# Altium integrated library Connectors.IntLib: 512 symbols (part 2 of 2) (continued)
## PLS-12RP (continued)

## PLS-14
designator CON?  (value not drawn)
2.54 mm; Note: Connector; Temp.Characteristic: -40C to +85C; Value: *; Publisher: Catcatcat Electronics; Website developer: http://catcatcat.d-lan.dp.ua/; Assembly type: Manual Part
footprint PLS-14
pins: 1, 2, 3, 4, 5, 6, 7, 8, 9, 10, 11, 12, 13, 14

## PLS-16
designator CON?  (value not drawn)
2.54 mm; Note: Connector; Temp.Characteristic: -40C to +85C; Value: *; Publisher: Catcatcat Electronics; Website developer: http://catcatcat.d-lan.dp.ua/; Assembly type: Manual Part
footprint PLS-16
pins: 1, 2, 3, 4, 5, 6, 7, 8, 9, 10, 11, 12, 13, 14, 15, 16

## PLS-20
designator CON?  (value not drawn)
2.54 mm; Note: Connector; Temp.Characteristic: -40C to +85C; Value: *; Publisher: Catcatcat Electronics; Website developer: http://catcatcat.d-lan.dp.ua/; Assembly type: Manual Part
footprint PLS-20
pins: 1, 2, 3, 4, 5, 6, 7, 8, 9, 10, 11, 12, 13, 14, 15, 16, 17, 18, 19, 20

## PLSR-02S
designator CON?  (value not drawn)
2.54 mm; Note: Connector; Temp.Characteristic: -40C to +85C; Value: *; Publisher: Catcatcat Electronics; Website developer: http://catcatcat.d-lan.dp.ua/; Assembly type: Manual Part
footprint PLSR-02S
pins: 1, 2

## PLSR-02SS
designator CON?  (value not drawn)
2.54 mm; Note: Connector; Temp.Characteristic: -40C to +85C; Value: *; Publisher: Catcatcat Electronics; Website developer: http://catcatcat.d-lan.dp.ua/; Assembly type: Manual Part
footprint PLSR-02SS
pins: 1, 2

## PLSR-03S
designator Con?  (value not drawn)
2.54 mm; Note: Connector; Temp.Characteristic: -40C to +85C; Value: *; Publisher: Catcatcat Electronics; Website developer: http://catcatcat.d-lan.dp.ua/; Assembly type: Manual Part
footprint PLSR-03S
pins: 1, 2, 3

## PLSR-03SS
designator CON?  (value not drawn)
2.54 mm; Note: Connector; Temp.Characteristic: -40C to +85C; Value: *; Publisher: Catcatcat Electronics; Website developer: http://catcatcat.d-lan.dp.ua/; Assembly type: Manual Part
footprint PLSR-03SS
pins: 1, 2, 3

## POWERJACKST
designator POWER?  (value not drawn)
Note: Connector; Temp.Characteristic: -40C to +85C; Value: *; Publisher: Catcatcat Electronics; Website developer: http://catcatcat.d-lan.dp.ua/; Assembly type: Manual Part
footprint POWERJACKST
pins: 1, 2, 3

## PowerTerminal
designator PT?  (value not drawn)
Note: Connector; Temp.Characteristic: -40C to +85C; Value: *; Publisher: Catcatcat Electronics; Website developer: http://catcatcat.d-lan.dp.ua/; Assembly type: Manual Part
footprint PowerTerminal
pins: 1, 2

## PS1R85-1-04-GB
designator CON?  (value not drawn)
Note: Connector; Temp.Characteristic: -40C to +85C; Value: *; Publisher: Catcatcat Electronics; Website developer: http://catcatcat.d-lan.dp.ua/; Assembly type: Manual Part
footprint PS1R85-1-04-GB
pins: 1, 2, 3, 4

## PS1R85-1-06-GB
designator CON?  (value not drawn)
Note: Connector; Temp.Characteristic: -40C to +85C; Value: *; Publisher: Catcatcat Electronics; Website developer: http://catcatcat.d-lan.dp.ua/; Assembly type: Manual Part
footprint PS1R85-1-06-GB
pins: 1, 2, 3, 4, 5, 6

## PS1R85-1-10-GB
designator CON?  (value not drawn)
Note: Connector; Temp.Characteristic: -40C to +85C; Value: *; Publisher: Catcatcat Electronics; Website developer: http://catcatcat.d-lan.dp.ua/; Assembly type: Manual Part
footprint PS1R85-1-10-GB
pins: 1, 2, 3, 4, 5, 6, 7, 8, 9, 10

## PS1R85-1-12-GB
designator CON?  (value not drawn)
Note: Connector; Temp.Characteristic: -40C to +85C; Value: *; Publisher: Catcatcat Electronics; Website developer: http://catcatcat.d-lan.dp.ua/; Assembly type: Manual Part
footprint PS1R85-1-12-GB
pins: 1, 2, 3, 4, 5, 6, 7, 8, 9, 10, 11, 12

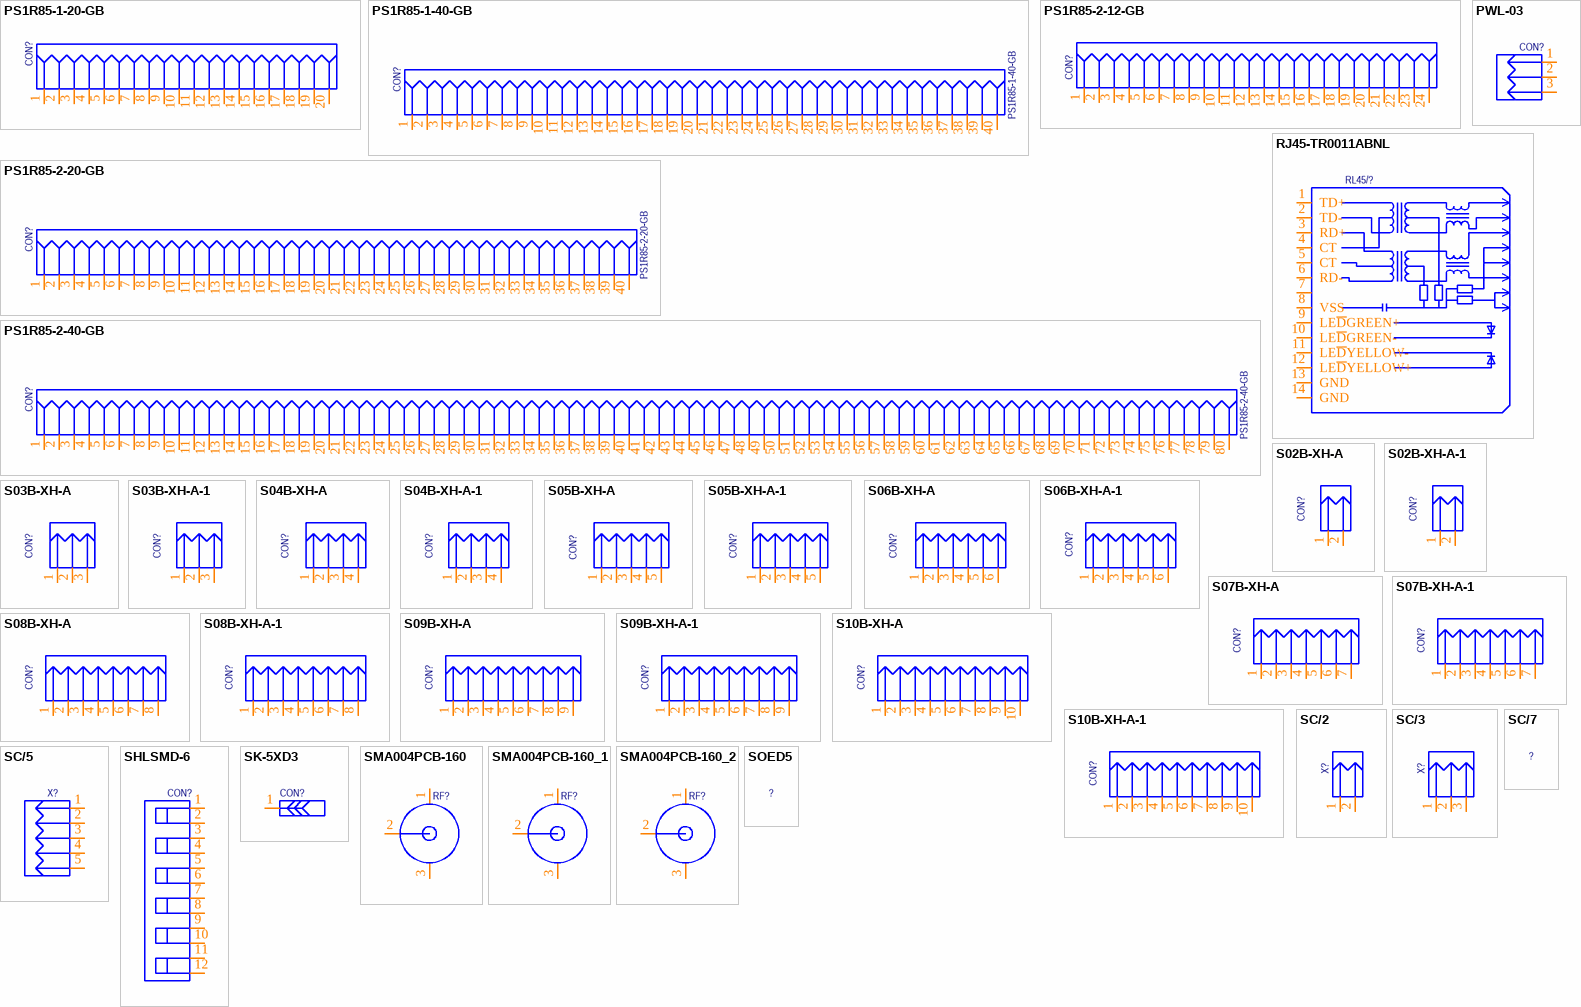
[diagram p10: symbols PS1R85-1-20-GB to SOED5]

## PS1R85-1-20-GB
designator CON?  (value not drawn)
Note: Connector; Temp.Characteristic: -40C to +85C; Value: *; Publisher: Catcatcat Electronics; Website developer: http://catcatcat.d-lan.dp.ua/; Assembly type: Manual Part
footprint PS1R85-1-20-GB
pins: 1, 2, 3, 4, 5, 6, 7, 8, 9, 10, 11, 12, 13, 14, 15, 16, 17, 18, 19, 20

## PS1R85-1-40-GB
designator CON?
Note: Connector; Temp.Characteristic: -40C to +85C; Value: *; Publisher: Catcatcat Electronics; Website developer: http://catcatcat.d-lan.dp.ua/; Assembly type: Manual Part
footprint PS1R85-1-40-GB
pins: 1, 2, 3, 4, 5, 6, 7, 8, 9, 10, 11, 12, 13, 14, 15, 16, 17, 18, 19, 20, 21, 22, 23, 24, 25, 26, 27, 28, 29, 30, 31, 32, 33, 34, 35, 36, 37, 38, 39, 40

## PS1R85-2-12-GB
designator CON?  (value not drawn)
Note: Connector; Temp.Characteristic: -40C to +85C; Value: *; Publisher: Catcatcat Electronics; Website developer: http://catcatcat.d-lan.dp.ua/; Assembly type: Manual Part
footprint PS1R85-2-12-GB
pins: 1, 2, 3, 4, 5, 6, 7, 8, 9, 10, 11, 12, 13, 14, 15, 16, 17, 18, 19, 20, 21, 22, 23, 24

## PS1R85-2-20-GB
designator CON?
Note: Connector; Temp.Characteristic: -40C to +85C; Value: *; Publisher: Catcatcat Electronics; Website developer: http://catcatcat.d-lan.dp.ua/; Assembly type: Manual Part
footprint PS1R85-2-20-GB
pins: 1, 2, 3, 4, 5, 6, 7, 8, 9, 10, 11, 12, 13, 14, 15, 16, 17, 18, 19, 20, 21, 22, 23, 24, 25, 26, 27, 28, 29, 30, 31, 32, 33, 34, 35, 36, 37, 38, 39, 40

## PS1R85-2-40-GB
designator CON?
Note: Connector; Temp.Characteristic: -40C to +85C; Value: *; Publisher: Catcatcat Electronics; Website developer: http://catcatcat.d-lan.dp.ua/; Assembly type: Manual Part
footprint PS1R85-2-40-GB
pins: 1, 2, 3, 4, 5, 6, 7, 8, 9, 10, 11, 12, 13, 14, 15, 16, 17, 18, 19, 20, 21, 22, 23, 24, 25, 26, 27, 28, 29, 30, 31, 32, 33, 34, 35, 36, 37, 38, 39, 40, 41, 42, 43, 44, 45, 46, 47, 48, 49, 50, 51, 52, 53, 54, 55, 56, 57, 58, 59, 60, 61, 62, 63, 64, 65, 66, 67, 68, 69, 70, 71, 72, 73, 74, 75, 76, 77, 78, 79, 80

## PWL-03
designator CON?  (value not drawn)
Note: Connector; Temp.Characteristic: -40C to +85C; Value: *; Publisher: Catcatcat Electronics; Website developer: http://catcatcat.d-lan.dp.ua/; Assembly type: Manual Part
footprint PWL-03
pins: 1, 2, 3

## RJ45-TR0011ABNL
designator RL45/?  (value not drawn)
Note: Connector; Temp.Characteristic: -40C to +85C; Value: *; Publisher: Catcatcat Electronics; Website developer: http://catcatcat.d-lan.dp.ua/; Assembly type: Manual Part
footprint RJ45-TR0011ABNL
pins: 1 TD+, 2 TD-, 3 RD+, 4 CT, 5 CT, 6 RD-, 7, 8 VSS, 9 LE~{D}GREEN+, 10 LE~{D}GREEN-, 11 LE~{D}YELLOW-, 12 LE~{D}YELLOW+, 13 GND, 14 GND, 15 hidden, 16 hidden

## S02B-XH-A
designator CON?  (value not drawn)
3 A 250 V 2.5 mm; Value: S02B-XH-A; Pricing Аlternative: 0.029; Note: Connector; Temp.Characteristic: -40C to +85C; ComponentLink1URL: http://www.jst-mfg.com; ComponentLink2URL: http://www.jst-mfg.com/product/images/pdf.gif; Dealer Digi-Key: https://detail.1688.com/offer/38233239228.html; Package / Case: 2.5 mm; PartNumber Digi-Key: S02B-XH-A; Pricing Digi-Key: 0.1; Publisher: Catcatcat Electronics; Voltage: 3 A 250 V 2.5 mm; Website developer: http://catcatcat.d-lan.dp.ua/; Assembly type: Manual Part
footprint S02B-XH-A
pins: 1, 2

## S02B-XH-A-1
designator CON?  (value not drawn)
3 A 250 V 2.5 mm; Value: S02B-XH-A-1; Pricing Аlternative: 0.029; Note: Connector; Temp.Characteristic: -40C to +85C; ComponentLink1URL: http://www.jst-mfg.com; ComponentLink2URL: http://www.jst-mfg.com/product/images/pdf.gif; Dealer Digi-Key: https://detail.1688.com/offer/38233239228.html; Package / Case: 2.5 mm; PartNumber Digi-Key: S02B-XH-A-1; Pricing Digi-Key: 0.1; Publisher: Catcatcat Electronics; Voltage: 3 A 250 V 2.5 mm; Website developer: http://catcatcat.d-lan.dp.ua/; Assembly type: Manual Part
footprint S02B-XH-A-1
pins: 1, 2

## S03B-XH-A
designator CON?  (value not drawn)
3 A 250 V 2.5 mm; Value: S03B-XH-A; Pricing Аlternative: 0.029; Note: Connector; Temp.Characteristic: -40C to +85C; ComponentLink1URL: http://www.jst-mfg.com; ComponentLink2URL: http://www.jst-mfg.com/product/images/pdf.gif; Dealer Digi-Key: https://detail.1688.com/offer/38233239228.html; Package / Case: 2.5 mm; PartNumber Digi-Key: S03B-XH-A; Pricing Digi-Key: 0.1; Publisher: Catcatcat Electronics; Voltage: 3 A 250 V 2.5 mm; Website developer: http://catcatcat.d-lan.dp.ua/; Assembly type: Manual Part
footprint S03B-XH-A
pins: 1, 2, 3

## S03B-XH-A-1
designator CON?  (value not drawn)
3 A 250 V 2.5 mm; Value: S03B-XH-A-1; Pricing Аlternative: 0.029; Note: Connector; Temp.Characteristic: -40C to +85C; ComponentLink1URL: http://www.jst-mfg.com; ComponentLink2URL: http://www.jst-mfg.com/product/images/pdf.gif; Dealer Digi-Key: https://detail.1688.com/offer/38233239228.html; Package / Case: 2.5 mm; PartNumber Digi-Key: S03B-XH-A-1; Pricing Digi-Key: 0.1; Publisher: Catcatcat Electronics; Voltage: 3 A 250 V 2.5 mm; Website developer: http://catcatcat.d-lan.dp.ua/; Assembly type: Manual Part
footprint S03B-XH-A-1
pins: 1, 2, 3

## S04B-XH-A
designator CON?  (value not drawn)
3 A 250 V 2.5 mm; Value: S04B-XH-A; Pricing Аlternative: 0.029; Note: Connector; Temp.Characteristic: -40C to +85C; ComponentLink1URL: http://www.jst-mfg.com; ComponentLink2URL: http://www.jst-mfg.com/product/images/pdf.gif; Dealer Digi-Key: https://detail.1688.com/offer/38233239228.html; Package / Case: 2.5 mm; PartNumber Digi-Key: S04B-XH-A; Pricing Digi-Key: 0.1; Publisher: Catcatcat Electronics; Voltage: 3 A 250 V 2.5 mm; Website developer: http://catcatcat.d-lan.dp.ua/; Assembly type: Manual Part
footprint S04B-XH-A
pins: 1, 2, 3, 4

## S04B-XH-A-1
designator CON?  (value not drawn)
3 A 250 V 2.5 mm; Value: S04B-XH-A-1; Pricing Аlternative: 0.029; Note: Connector; Temp.Characteristic: -40C to +85C; ComponentLink1URL: http://www.jst-mfg.com; ComponentLink2URL: http://www.jst-mfg.com/product/images/pdf.gif; Dealer Digi-Key: https://detail.1688.com/offer/38233239228.html; Package / Case: 2.5 mm; PartNumber Digi-Key: S04B-XH-A-1; Pricing Digi-Key: 0.1; Publisher: Catcatcat Electronics; Voltage: 3 A 250 V 2.5 mm; Website developer: http://catcatcat.d-lan.dp.ua/; Assembly type: Manual Part
footprint S04B-XH-A-1
pins: 1, 2, 3, 4

## S05B-XH-A
designator CON?  (value not drawn)
3 A 250 V 2.5 mm; Value: S05B-XH-A; Pricing Аlternative: 0.029; Note: Connector; Temp.Characteristic: -40C to +85C; ComponentLink1URL: http://www.jst-mfg.com; ComponentLink2URL: http://www.jst-mfg.com/product/images/pdf.gif; Dealer Digi-Key: https://detail.1688.com/offer/38233239228.html; Package / Case: 2.5 mm; PartNumber Digi-Key: S05B-XH-A; Pricing Digi-Key: 0.1; Publisher: Catcatcat Electronics; Voltage: 3 A 250 V 2.5 mm; Website developer: http://catcatcat.d-lan.dp.ua/; Assembly type: Manual Part
footprint S05B-XH-A
pins: 1, 2, 3, 4, 5

## S05B-XH-A-1
designator CON?  (value not drawn)
3 A 250 V 2.5 mm; Value: S05B-XH-A-1; Pricing Аlternative: 0.029; Note: Connector; Temp.Characteristic: -40C to +85C; ComponentLink1URL: http://www.jst-mfg.com; ComponentLink2URL: http://www.jst-mfg.com/product/images/pdf.gif; Dealer Digi-Key: https://detail.1688.com/offer/38233239228.html; Package / Case: 2.5 mm; PartNumber Digi-Key: S05B-XH-A-1; Pricing Digi-Key: 0.1; Publisher: Catcatcat Electronics; Voltage: 3 A 250 V 2.5 mm; Website developer: http://catcatcat.d-lan.dp.ua/; Assembly type: Manual Part
footprint S05B-XH-A-1
pins: 1, 2, 3, 4, 5

## S06B-XH-A
designator CON?  (value not drawn)
3 A 250 V 2.5 mm; Value: S06B-XH-A; Pricing Аlternative: 0.029; Note: Connector; Temp.Characteristic: -40C to +85C; ComponentLink1URL: http://www.jst-mfg.com; ComponentLink2URL: http://www.jst-mfg.com/product/images/pdf.gif; Dealer Digi-Key: https://detail.1688.com/offer/38233239228.html; Package / Case: 2.5 mm; PartNumber Digi-Key: S06B-XH-A; Pricing Digi-Key: 0.1; Publisher: Catcatcat Electronics; Voltage: 3 A 250 V 2.5 mm; Website developer: http://catcatcat.d-lan.dp.ua/; Assembly type: Manual Part
footprint S06B-XH-A
pins: 1, 2, 3, 4, 5, 6

## S06B-XH-A-1
designator CON?  (value not drawn)
3 A 250 V 2.5 mm; Value: S06B-XH-A-1; Pricing Аlternative: 0.029; Note: Connector; Temp.Characteristic: -40C to +85C; ComponentLink1URL: http://www.jst-mfg.com; ComponentLink2URL: http://www.jst-mfg.com/product/images/pdf.gif; Dealer Digi-Key: https://detail.1688.com/offer/38233239228.html; Package / Case: 2.5 mm; PartNumber Digi-Key: S06B-XH-A-1; Pricing Digi-Key: 0.1; Publisher: Catcatcat Electronics; Voltage: 3 A 250 V 2.5 mm; Website developer: http://catcatcat.d-lan.dp.ua/; Assembly type: Manual Part
footprint S06B-XH-A-1
pins: 1, 2, 3, 4, 5, 6

## S07B-XH-A
designator CON?  (value not drawn)
3 A 250 V 2.5 mm; Value: S07B-XH-A; Pricing Аlternative: 0.029; Note: Connector; Temp.Characteristic: -40C to +85C; ComponentLink1URL: http://www.jst-mfg.com; ComponentLink2URL: http://www.jst-mfg.com/product/images/pdf.gif; Dealer Digi-Key: https://detail.1688.com/offer/38233239228.html; Package / Case: 2.5 mm; PartNumber Digi-Key: S07B-XH-A; Pricing Digi-Key: 0.1; Publisher: Catcatcat Electronics; Voltage: 3 A 250 V 2.5 mm; Website developer: http://catcatcat.d-lan.dp.ua/; Assembly type: Manual Part
footprint S07B-XH-A
pins: 1, 2, 3, 4, 5, 6, 7

## S07B-XH-A-1
designator CON?  (value not drawn)
3 A 250 V 2.5 mm; Value: S07B-XH-A-1; Pricing Аlternative: 0.029; Note: Connector; Temp.Characteristic: -40C to +85C; ComponentLink1URL: http://www.jst-mfg.com; ComponentLink2URL: http://www.jst-mfg.com/product/images/pdf.gif; Dealer Digi-Key: https://detail.1688.com/offer/38233239228.html; Package / Case: 2.5 mm; PartNumber Digi-Key: S07B-XH-A-1; Pricing Digi-Key: 0.1; Publisher: Catcatcat Electronics; Voltage: 3 A 250 V 2.5 mm; Website developer: http://catcatcat.d-lan.dp.ua/; Assembly type: Manual Part
footprint S07B-XH-A-1
pins: 1, 2, 3, 4, 5, 6, 7

## S08B-XH-A
designator CON?  (value not drawn)
3 A 250 V 2.5 mm; Value: S08B-XH-A; Pricing Аlternative: 0.029; Note: Connector; Temp.Characteristic: -40C to +85C; ComponentLink1URL: http://www.jst-mfg.com; ComponentLink2URL: http://www.jst-mfg.com/product/images/pdf.gif; Dealer Digi-Key: https://detail.1688.com/offer/38233239228.html; Package / Case: 2.5 mm; PartNumber Digi-Key: S08B-XH-A; Pricing Digi-Key: 0.1; Publisher: Catcatcat Electronics; Voltage: 3 A 250 V 2.5 mm; Website developer: http://catcatcat.d-lan.dp.ua/; Assembly type: Manual Part
footprint S08B-XH-A
pins: 1, 2, 3, 4, 5, 6, 7, 8

## S08B-XH-A-1
designator CON?  (value not drawn)
3 A 250 V 2.5 mm; Value: S08B-XH-A-1; Pricing Аlternative: 0.029; Note: Connector; Temp.Characteristic: -40C to +85C; ComponentLink1URL: http://www.jst-mfg.com; ComponentLink2URL: http://www.jst-mfg.com/product/images/pdf.gif; Dealer Digi-Key: https://detail.1688.com/offer/38233239228.html; Package / Case: 2.5 mm; PartNumber Digi-Key: S08B-XH-A-1; Pricing Digi-Key: 0.1; Publisher: Catcatcat Electronics; Voltage: 3 A 250 V 2.5 mm; Website developer: http://catcatcat.d-lan.dp.ua/; Assembly type: Manual Part
footprint S08B-XH-A-1
pins: 1, 2, 3, 4, 5, 6, 7, 8

## S09B-XH-A
designator CON?  (value not drawn)
3 A 250 V 2.5 mm; Value: S09B-XH-A; Pricing Аlternative: 0.029; Note: Connector; Temp.Characteristic: -40C to +85C; ComponentLink1URL: http://www.jst-mfg.com; ComponentLink2URL: http://www.jst-mfg.com/product/images/pdf.gif; Dealer Digi-Key: https://detail.1688.com/offer/38233239228.html; Package / Case: 2.5 mm; PartNumber Digi-Key: S09B-XH-A; Pricing Digi-Key: 0.1; Publisher: Catcatcat Electronics; Voltage: 3 A 250 V 2.5 mm; Website developer: http://catcatcat.d-lan.dp.ua/; Assembly type: Manual Part
footprint S09B-XH-A
pins: 1, 2, 3, 4, 5, 6, 7, 8, 9

## S09B-XH-A-1
designator CON?  (value not drawn)
3 A 250 V 2.5 mm; Value: S09B-XH-A-1; Pricing Аlternative: 0.029; Note: Connector; Temp.Characteristic: -40C to +85C; ComponentLink1URL: http://www.jst-mfg.com; ComponentLink2URL: http://www.jst-mfg.com/product/images/pdf.gif; Dealer Digi-Key: https://detail.1688.com/offer/38233239228.html; Package / Case: 2.5 mm; PartNumber Digi-Key: S09B-XH-A-1; Pricing Digi-Key: 0.1; Publisher: Catcatcat Electronics; Voltage: 3 A 250 V 2.5 mm; Website developer: http://catcatcat.d-lan.dp.ua/; Assembly type: Manual Part
footprint S09B-XH-A-1
pins: 1, 2, 3, 4, 5, 6, 7, 8, 9

## S10B-XH-A
designator CON?  (value not drawn)
3 A 250 V 2.5 mm; Value: S10B-XH-A; Pricing Аlternative: 0.029; Note: Connector; Temp.Characteristic: -40C to +85C; ComponentLink1URL: http://www.jst-mfg.com; ComponentLink2URL: http://www.jst-mfg.com/product/images/pdf.gif; Dealer Digi-Key: https://detail.1688.com/offer/38233239228.html; Package / Case: 2.5 mm; PartNumber Digi-Key: S10B-XH-A; Pricing Digi-Key: 0.1; Publisher: Catcatcat Electronics; Voltage: 3 A 250 V 2.5 mm; Website developer: http://catcatcat.d-lan.dp.ua/; Assembly type: Manual Part
footprint S10B-XH-A
pins: 1, 2, 3, 4, 5, 6, 7, 8, 9, 10

## S10B-XH-A-1
designator CON?  (value not drawn)
3 A 250 V 2.5 mm; Value: S10B-XH-A-1; Pricing Аlternative: 0.029; Note: Connector; Temp.Characteristic: -40C to +85C; ComponentLink1URL: http://www.jst-mfg.com; ComponentLink2URL: http://www.jst-mfg.com/product/images/pdf.gif; Dealer Digi-Key: https://detail.1688.com/offer/38233239228.html; Package / Case: 2.5 mm; PartNumber Digi-Key: S10B-XH-A-1; Pricing Digi-Key: 0.1; Publisher: Catcatcat Electronics; Voltage: 3 A 250 V 2.5 mm; Website developer: http://catcatcat.d-lan.dp.ua/; Assembly type: Manual Part
footprint S10B-XH-A-1
pins: 1, 2, 3, 4, 5, 6, 7, 8, 9, 10

## SC/2
designator X?  (value not drawn)
Note: Connector; Temp.Characteristic: -40C to +85C; Value: *; Publisher: Catcatcat Electronics; Website developer: http://catcatcat.d-lan.dp.ua/; Assembly type: Manual Part
footprint SC/2
pins: 1, 2

## SC/3
designator X?  (value not drawn)
Note: Connector; Temp.Characteristic: -40C to +85C; Value: *; Publisher: Catcatcat Electronics; Website developer: http://catcatcat.d-lan.dp.ua/; Assembly type: Manual Part
footprint SC/3
pins: 1, 2, 3

## SC/5
designator X?  (value not drawn)
Note: Connector; Temp.Characteristic: -40C to +85C; Value: *; Publisher: Catcatcat Electronics; Website developer: http://catcatcat.d-lan.dp.ua/; Assembly type: Manual Part
footprint SC/5
pins: 1, 2, 3, 4, 5

## SC/7
designator ?  (value not drawn)
Note: Connector; Temp.Characteristic: -40C to +85C; Value: *; Publisher: Catcatcat Electronics; Website developer: http://catcatcat.d-lan.dp.ua/; Assembly type: Manual Part
footprint JST/7
pins: 1 hidden, 2 hidden, 3 hidden, 4 hidden, 5 hidden, 6 hidden, 7 hidden

## SHLSMD-6
designator CON?  (value not drawn)
Note: Connector; Temp.Characteristic: -40C to +85C; Value: *; Publisher: Catcatcat Electronics; Website developer: http://catcatcat.d-lan.dp.ua/; Assembly type: Manual Part
footprint SHLSMD-6
pins: 1, 2, 3, 4, 5, 6, 7, 8, 9, 10, 11, 12

## SK-5XD3
designator CON?  (value not drawn)
Note: Connector; Temp.Characteristic: -40C to +85C; Value: *; Publisher: Catcatcat Electronics; Website developer: http://catcatcat.d-lan.dp.ua/; Assembly type: Manual Part
footprint SK-5XD3
pins: 1

## SMA004PCB-160
designator RF?  (value not drawn)
Note: Connector; Temp.Characteristic: -40C to +85C; Publisher: Catcatcat Electronics; Website developer: http://catcatcat.d-lan.dp.ua/; Assembly type: Manual Part
footprint SMA004PCB-160
pins: 1 GND, 2 RF, 3 GND

## SMA004PCB-160_1
designator RF?  (value not drawn)
Note: Connector; Temp.Characteristic: -40C to +85C; Publisher: Catcatcat Electronics; Website developer: http://catcatcat.d-lan.dp.ua/; Assembly type: Manual Part
footprint SMA004PCB-160-1
pins: 1 GND, 2 RF, 3 GND

## SMA004PCB-160_2
designator RF?  (value not drawn)
Note: Connector; Temp.Characteristic: -40C to +85C; Publisher: Catcatcat Electronics; Website developer: http://catcatcat.d-lan.dp.ua/; Assembly type: Manual Part
footprint SMA004PCB-160-2
pins: 1 GND, 2 RF, 3 GND

## SOED5
designator ?  (value not drawn)
Note: Connector; Temp.Characteristic: -40C to +85C; Value: *; Publisher: Catcatcat Electronics; Website developer: http://catcatcat.d-lan.dp.ua/; Assembly type: Manual Part
footprint SOED5
pins: 1 hidden, 2 hidden, 3 hidden, 4 hidden, 5 hidden

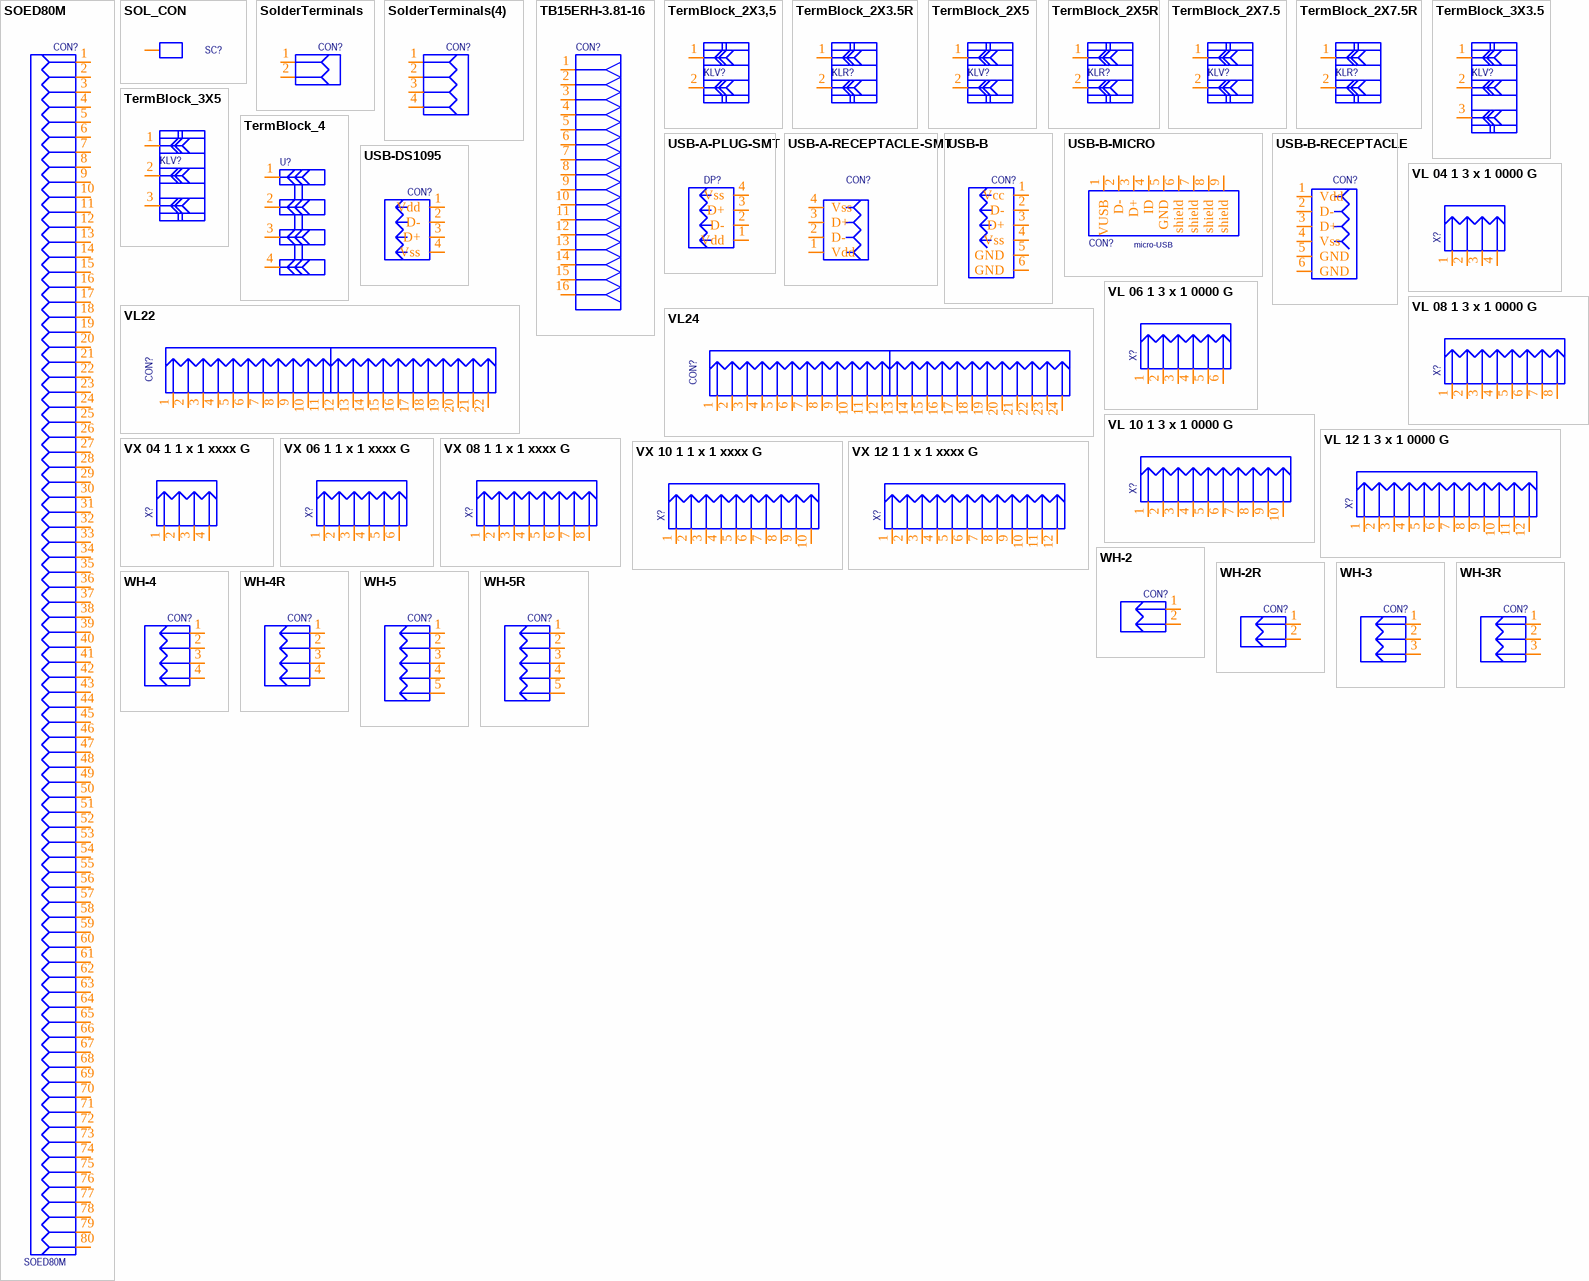
[diagram p11: symbols SOED80M to WH-5R]

## SOED80M
designator CON?
Note: Connector; Temp.Characteristic: -40C to +85C; Value: *; Publisher: Catcatcat Electronics; Website developer: http://catcatcat.d-lan.dp.ua/; Assembly type: Manual Part
footprint SOED80M
pins: 1, 2, 3, 4, 5, 6, 7, 8, 9, 10, 11, 12, 13, 14, 15, 16, 17, 18, 19, 20, 21, 22, 23, 24, 25, 26, 27, 28, 29, 30, 31, 32, 33, 34, 35, 36, 37, 38, 39, 40, 41, 42, 43, 44, 45, 46, 47, 48, 49, 50, 51, 52, 53, 54, 55, 56, 57, 58, 59, 60, 61, 62, 63, 64, 65, 66, 67, 68, 69, 70, 71, 72, 73, 74, 75, 76, 77, 78, 79, 80

## SOL_CON
designator SC?  (value not drawn)
Note: Connector; Temp.Characteristic: -40C to +85C; Value: *; Publisher: Catcatcat Electronics; Website developer: http://catcatcat.d-lan.dp.ua/; Assembly type: Manual Part
footprint SOL_CON
pins: 1

## SolderTerminals
designator CON?  (value not drawn)
Note: Connector; Temp.Characteristic: -40C to +85C; Value: *; Publisher: Catcatcat Electronics; Website developer: http://catcatcat.d-lan.dp.ua/; Assembly type: Manual Part
footprint SolderTerminals
pins: 1, 2

## SolderTerminals(4)
designator CON?  (value not drawn)
Note: Connector; Temp.Characteristic: -40C to +85C; Value: *; Publisher: Catcatcat Electronics; Website developer: http://catcatcat.d-lan.dp.ua/; Assembly type: Manual Part
footprint SolderTerminals(4)
pins: 1, 2, 3, 4

## TB15ERH-3.81-16
designator CON?  (value not drawn)
Assembly type: Manual Part
footprint TB15ERH-3.81-16
pins: 1, 2, 3, 4, 5, 6, 7, 8, 9, 10, 11, 12, 13, 14, 15, 16

## TermBlock_2Х3,5
designator KLV?  (value not drawn)
Note: Connector; Temp.Characteristic: -40C to +85C; Value: *; Publisher: Catcatcat Electronics; Website developer: http://catcatcat.d-lan.dp.ua/; Assembly type: Manual Part
footprint TermBlock_2Х3.5
pins: 1, 2

## TermBlock_2Х3.5R
designator KLR?  (value not drawn)
Note: Connector; Temp.Characteristic: -40C to +85C; Value: *; Publisher: Catcatcat Electronics; Website developer: http://catcatcat.d-lan.dp.ua/; Assembly type: Manual Part
footprint TermBlock_2Х3.5R
pins: 1, 2

## TermBlock_2Х5
designator KLV?  (value not drawn)
Note: Connector; Temp.Characteristic: -40C to +85C; Value: *; Publisher: Catcatcat Electronics; Website developer: http://catcatcat.d-lan.dp.ua/; Assembly type: Manual Part
footprint TermBlock_2Х5
pins: 1, 2

## TermBlock_2Х5R
designator KLR?  (value not drawn)
Note: Connector; Temp.Characteristic: -40C to +85C; Value: *; Publisher: Catcatcat Electronics; Website developer: http://catcatcat.d-lan.dp.ua/; Assembly type: Manual Part
footprint TermBlock_2Х5R
pins: 1, 2
